# Altium footprint library MEBot.PcbLib: 161 footprints (part 1 of 11)
Each footprint in its own frame and in the unit in brackets; x right, y up, seen from the top. Pads: shape width x height; smd on the part's side, far side on the other; paste and mask are expansions set on the pad; w line width, h text height; cw(c..) or ccw(c..) is an arc to the next point about the centre after c.
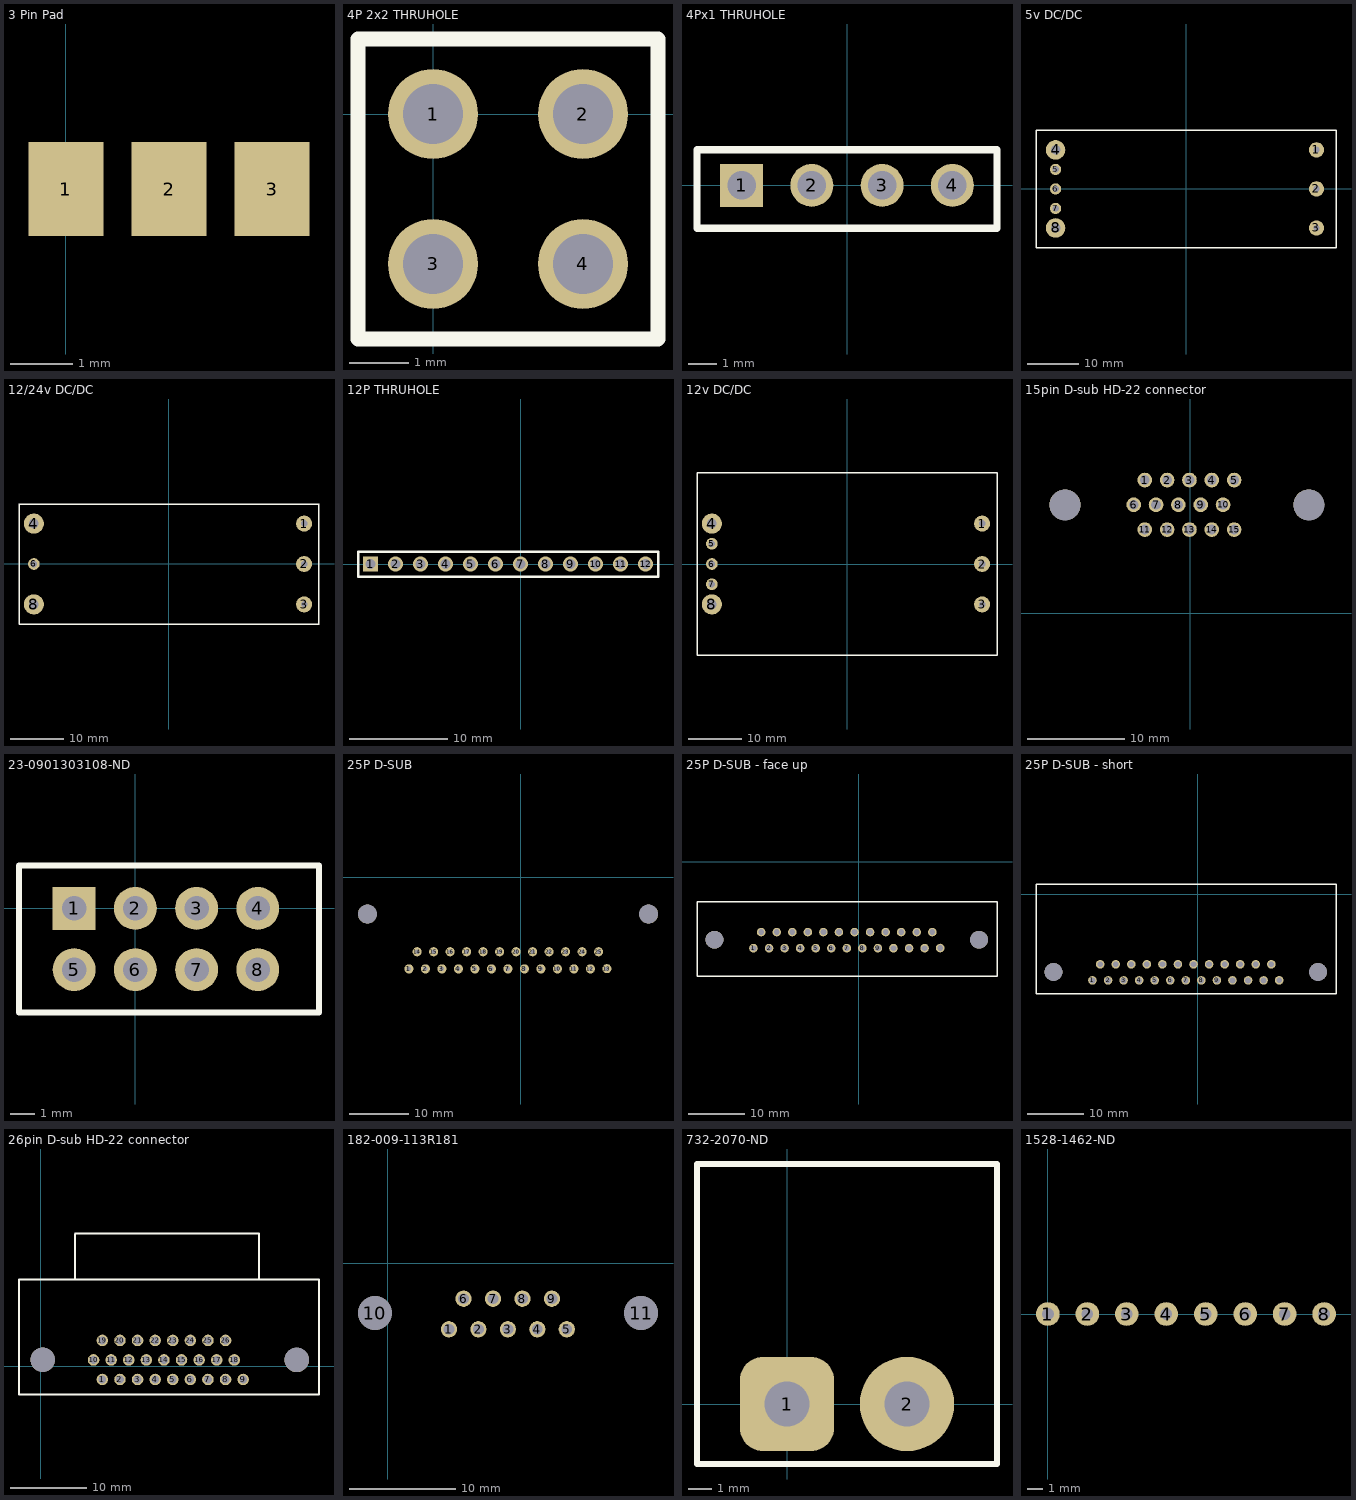
[diagram p0: the footprints below, top view; thin cyan lines are the x and y axes]

## 3 Pin Pad [mm] "3 Pads for AS5600"
pads (3):
  rect 1.2x1.5 smd: 1(0,-3.937) 2(1.651,-3.937) 3(3.302,-3.937)

## 4P 2x2 THRUHOLE [mil] "4P Naked header"
pads (4):
  round 60 hole 40: 1(0,0) 2(100,0) 3(0,-100) 4(100,-100)
Top Overlay:
  lines w10: -50,-150 -50,50 150,50 150,-150 -50,-150
3D body "Pin Header 2x2 TH Pitch 2.54mm.stp": height 373.85, standoff -125.98, extent -50,-150 150,50

## 4Px1 THRUHOLE [mil] "4P Naked header"
height 433.07
pads (4):
  rect 60x60 hole 40: 1(-147.64,0)
  round 60 hole 40: 2(-49.21,0) 3(49.21,0) 4(147.64,0)
Top Overlay:
  lines w10: -210,-60 210,-60 210,50 -210,50 -210,-60
3D body "Pin Header 4 x 1 TH 2.54mm Pitch.stp": height 350, standoff -100, extent -200,-49.99 200,50.01

## 5v DC/DC [mm] "Datel ULE-5/12-D24P-C DC/DC converter"
height 9
pads (8):
  round 3 hole 1.25: 1(25.4,7.6) 2(25.4,0) 3(25.4,-7.6)
  round 3.8 hole 1.825: 4(-25.4,7.6) 8(-25.4,-7.6)
  round 2.2 hole 1.25: 5(-25.4,3.8) 6(-25.4,0) 7(-25.4,-3.8)
Top Overlay:
  lines w0.254: -29.21,-11.47 -29.21,11.43 ; -29.2,-11.45 29.2,-11.45 29.2,11.45 -29.2,11.45

## 12/24v DC/DC [mm] "ULE-12/4.2-D24P-C DC/DC converter"
height 9
pads (6):
  round 3 hole 1.25: 1(25.4,7.6) 2(25.4,0) 3(25.4,-7.6)
  round 3.8 hole 1.825: 4(-25.4,7.6) 8(-25.4,-7.6)
  round 2.2 hole 1.25: 6(-25.4,0)
Top Overlay:
  lines w0.254: -28.2,-11.3 -28.2,11.3 ; -28.194,-11.303 28.206,-11.303 ; -28.194,11.252 28.206,11.252 ; 28.2,-11.3 28.2,11.3
3D body: height 7.95, standoff 0, extent -28.327,-11.43 28.333,11.427
3D body: height 2.54, standoff 0, extent -26.304,6.706 -24.486,8.528
3D body: height 2.54, standoff 0, extent -26.309,-8.528 -24.491,-6.706
3D body: height 2.54, standoff 0, extent 24.765,6.985 26.01,8.232
3D body: height 2.54, standoff 0, extent 24.79,-0.61 26.035,0.638
3D body: height 2.54, standoff 0, extent 24.765,-8.218 26.01,-6.971
3D body: height 2.54, standoff 0, extent -26.035,-0.61 -24.79,0.638

## 12P THRUHOLE [mil] "12 Naked header"
height 433.07
pads (12):
  rect 60x60 hole 40: 1(-600,0)
  round 60 hole 40: 2(-500,0) 3(-400,0) 4(-300,0) 5(-200,0) 6(-100,0) 7(0,0) 8(100,0) 9(200,0) 10(300,0) 11(400,0) 12(500,0)
Top Overlay:
  lines w10: -650,-50 550,-50 550,50 -650,50 -650,-50
3D body "Pin Header 12 x 1 TH 2.54mm Pitch.stp": height 350, standoff -100, extent -650,-50 550,50

## 12v DC/DC [mm] "Datel 580-ULQ12-8-D24P-C DC/DC converter"
pads (8):
  round 3 hole 1.25: 1(25.4,7.6) 2(25.4,0) 3(25.4,-7.6)
  round 3.8 hole 1.825: 4(-25.4,7.6) 8(-25.4,-7.6)
  round 2.2 hole 1.25: 5(-25.4,3.81) 6(-25.4,0) 7(-25.4,-3.81)
Top Overlay:
  lines w0.254: -28.2,-17.15 28.2,-17.15 28.2,17.15 -28.2,17.15 -28.2,-17.15

## 15pin D-sub HD-22 connector [mm]
height 12.5
pads (17):
  round 1.5 hole 1: 1(-4.668,13.665) 2(-2.378,13.665) 3(-0.088,13.665) 4(2.202,13.665) 5(4.492,13.665) 6(-5.808,11.125) 7(-3.518,11.125) 8(-1.228,11.125) 9(1.062,11.125) 10(3.352,11.125) 11(-4.668,8.585) 12(-2.378,8.585) 13(-0.088,8.585) 14(2.202,8.585) 15(4.492,8.585)
  round 3.18 hole 3.18: ""(-12.848,11.125) ""(12.142,11.125)
Bottom Overlay:
  lines w0.254: -8.56,-5.867 -8.56,0 8.001,0 8.001,-5.893 -8.534,-5.893 ; -15.824,0.025 14.935,0.025 14.935,16.002 -15.824,16.002 -15.824,0.025
3D body "15pin dsub connector.STEP": height 13.6, standoff 0, extent -15.646,-5.972 15.354,16.028

## 23-0901303108-ND [mil] "STRAIGHT PIN HEADER 8P RA"
pads (8):
  rect 70x70 hole 40: 1(-100,0)
  round 70 hole 40: 2(0,0) 3(100,0) 4(200,0) 5(-100,-100) 6(0,-100) 7(100,-100) 8(200,-100)
Top Overlay:
  lines w10: -190,-170 -190,70 300,70 300,-170 -190,-170
3D body "901303108.stp": height 388.78, standoff -109.25, extent -196.06,-514.57 296.06,13.11

## 25P D-SUB [mil]
pads (27):
  round 60 hole 30: 1(-738.28,-604.28) 2(-629.28,-604.28) 3(-520.28,-604.28) 4(-411.28,-604.28) 5(-302.28,-604.28) 6(-193.28,-604.28) 7(-84.28,-604.28) 8(24.72,-604.28) 9(133.72,-604.28) 10(242.72,-604.28) 11(351.72,-604.28) 12(460.72,-604.28) 13(569.72,-603.28) 14(-684.28,-491.28) 15(-575.28,-491.28) 16(-466.28,-491.28) 17(-357.28,-491.28) 18(-248.28,-491.28) 19(-139.28,-491.28) 20(-30.28,-491.28) 21(78.72,-491.28) 22(187.72,-491.28) 23(296.72,-491.28) 24(405.72,-491.28) 25(514.72,-491.28)
  round 125 hole 125: ""(-1012.28,-242.28) ""(844.72,-242.28)
3D body "25P D-SUB.step": height 506.06, standoff -135.67, extent -1130.55,-385.18 960,370.72

## 25P D-SUB - face up [mil]
pads (27):
  round 60 hole 40: 1(-738.28,-604.28) 2(-629.28,-604.28) 3(-520.28,-604.28) 4(-411.28,-604.28) 5(-302.28,-604.28) 6(-193.28,-604.28) 7(-84.28,-604.28) 8(24.72,-604.28) 9(133.72,-604.28) 10(242.72,-604.28) 11(351.72,-604.28) 12(460.72,-604.28) 13(569.72,-603.28) 14(-684.28,-491.28) 15(-575.28,-491.28) 16(-466.28,-491.28) 17(-357.28,-491.28) 18(-248.28,-491.28) 19(-139.28,-491.28) 20(-30.28,-491.28) 21(78.72,-491.28) 22(187.72,-491.28) 23(296.72,-491.28) 24(405.72,-491.28) 25(514.72,-491.28)
  round 125 hole 125: ""(-1012,-545) ""(842,-545)
Top Overlay:
  lines w10: -1134,-800 -1134,-280 968,-280 968,-800 -1134,-800
3D body "c-3-1634224-2-h-3d.stp": height 500, standoff -175.2, extent -1130.55,-797.05 960,-302.95

## 25P D-SUB - short [mil]
pads (27):
  round 60 hole 40: 1(-738.28,-604.28) 2(-629.28,-604.28) 3(-520.28,-604.28) 4(-411.28,-604.28) 5(-302.28,-604.28) 6(-193.28,-604.28) 7(-84.28,-604.28) 8(24.72,-604.28) 9(133.72,-604.28) 10(242.72,-604.28) 11(351.72,-604.28) 12(460.72,-604.28) 13(569.72,-603.28) 14(-684.28,-491.28) 15(-575.28,-491.28) 16(-466.28,-491.28) 17(-357.28,-491.28) 18(-248.28,-491.28) 19(-139.28,-491.28) 20(-30.28,-491.28) 21(78.72,-491.28) 22(187.72,-491.28) 23(296.72,-491.28) 24(405.72,-491.28) 25(514.72,-491.28)
  round 125 hole 125: ""(-1012,-545) ""(842,-545)
Top Overlay:
  lines w10: -1134,-697 968,-697 968,69 -1134,69 -1134,-697
3D body "25P D-SUB.step": height 506.06, standoff -135.67, extent -1130,-691 960.55,64.91

## 26pin D-sub HD-22 connector [mm]
height 12.5
pads (28):
  round 1.5 hole 1: 1(8.03,-1.702) 2(10.32,-1.702) 3(12.61,-1.702) 4(14.9,-1.702) 5(17.19,-1.702) 6(19.48,-1.702) 7(21.77,-1.702) 8(24.06,-1.702) 9(26.35,-1.702) 10(6.88,0.838) 11(9.17,0.838) 12(11.46,0.838) 13(13.75,0.838) 14(16.04,0.838) 15(18.33,0.838) 16(20.62,0.838) 17(22.91,0.838) 18(25.2,0.838) 19(8.03,3.378) 20(10.32,3.378) 21(12.61,3.378) 22(14.9,3.378) 23(17.19,3.378) 24(19.48,3.378) 25(21.77,3.378) 26(24.06,3.378)
  round 3.18 hole 3.18: ""(0.254,0.864) ""(33.32,0.838)
Top Overlay:
  lines w0.254: -2.819,-3.632 -2.819,11.303 36.195,11.303 36.22,11.278 36.22,-3.632 36.195,-3.658 -2.794,-3.658 -2.819,-3.632 ; 4.445,11.303 28.423,11.303 28.423,17.247 28.372,17.297 4.521,17.297 4.445,17.221 4.445,11.303
3D body "26pin dsub connector.STEP": height 12.55, standoff 0, extent -3.029,-3.601 36.271,17.399

## 182-009-113R181 [mil] "CONN D-SUB PLUG 9POS R/A SLDR"
pads (11):
  round 60 hole 40: 1(227.11,-244.66) 2(336.11,-244.66) 3(445.11,-244.66) 4(554.11,-244.66) 5(663.11,-244.66) 6(281.11,-131.66) 7(390.11,-131.66) 8(499.11,-131.66) 9(608.11,-131.66)
  round 125 hole 125: 10(-46.89,-184.66) 11(938.11,-184.66)
3D body "9P D-SUB.step": height 115.67, standoff -526.06, extent -162.39,-332.66 1050.61,423.24

## 732-2070-ND [mm] "TERM BLOCK HDR 2POS 5.08MM"
height 31
pads (2):
  rrect50% 4x4 hole 1.9: 1(0,0)
  round 4 hole 1.9: 2(5.08,0)
Top Overlay:
  lines w0.254: -3.81,-2.54 -3.81,10.16 8.89,10.16 8.89,-2.54 -3.81,-2.54
3D body "Download_STP_691313510002_rev1.stp": height 8.45, standoff -3.55, extent -3.54,-1.84 8.62,10.16

## 1528-1462-ND [mil] "MICROSD CARD BREAKOUT 5V OR 3V"
pads (8):
  round 60 hole 30: 1(0,0) 2(100,0) 3(200,0) 4(300,0) 5(400,0) 6(500,0) 7(600,0) 8(700,0)
3D body "microsdcard_arduino.STEP": height 190, standoff 90, extent -150,-1185 850,65